# Altium schematic symbol library jlcpcb_2025_04_capacitors_extended_0603.schlib: 3668 symbols (part 18 of 20) (continued)
## HGC0603G0180J500NTHJ
designator C?  Capacitance: 18pF  (hidden comment: *)
Capacitor, Ceramic (MLCC), 18pF, ±5%, 50V, C0G, ±5%, SMD 0603; Manufacturer: Chinocera; Manufacturer Part Number: HGC0603G0180J500NTHJ; Package Size: 0603; JLCPCB Basic Part: No; JLCPCB Part Number: C482469; Supplier 1: LCSC; Category: Capacitors - MLCC; Supplier Part Number 1: C482469; Tolerance: ±5%; Voltage Rating: 50V; Temperature Coefficient: C0G; RoHS: Yes; ComponentLink1Description: Datasheet; ComponentLink1URL: https://wmsc.lcsc.com/wmsc/upload/file/pdf/v2/lcsc/2403201120_Chinocera-HGC0603G0180J500NTHJ_C482469.pdf; ComponentLink2Description: JLCPCB Part URL; ComponentLink2URL: https://jlcpcb.com/partdetail/C482469; ComponentLink3Description: LCSC Part URL; ComponentLink3URL: https://lcsc.com/product-detail/Multilayer-Ceramic-Capacitors-MLCC---SMD-SMT_Chinocera-Chinocera-HGC0603G0180J500NTHJ_C482469.html
footprint CAP-0603 (0603 (1608M) Capacitor)
pins: 1, 2

## HGC0603G0200J500NTHJ
designator C?  Capacitance: 20pF  (hidden comment: *)
Capacitor, Ceramic (MLCC), 20pF, ±5%, 50V, C0G, ±5%, SMD 0603; Manufacturer: Chinocera; Manufacturer Part Number: HGC0603G0200J500NTHJ; Package Size: 0603; JLCPCB Basic Part: No; JLCPCB Part Number: C465157; Supplier 1: LCSC; Category: Capacitors - MLCC; Supplier Part Number 1: C465157; Tolerance: ±5%; Voltage Rating: 50V; Temperature Coefficient: C0G; RoHS: Yes; ComponentLink1Description: Datasheet; ComponentLink1URL: https://wmsc.lcsc.com/wmsc/upload/file/pdf/v2/lcsc/2403201120_Chinocera-HGC0603G0200J500NTHJ_C465157.pdf; ComponentLink2Description: JLCPCB Part URL; ComponentLink2URL: https://jlcpcb.com/partdetail/C465157; ComponentLink3Description: LCSC Part URL; ComponentLink3URL: https://lcsc.com/product-detail/Multilayer-Ceramic-Capacitors-MLCC---SMD-SMT_Chinocera-Chinocera-HGC0603G0200J500NTHJ_C465157.html
footprint CAP-0603 (0603 (1608M) Capacitor)
pins: 1, 2

## HGC0603G0220J500NTHJ
designator C?  Capacitance: 22pF  (hidden comment: *)
Capacitor, Ceramic (MLCC), 22pF, ±5%, 50V, C0G, ±5%, SMD 0603; Manufacturer: Chinocera; Manufacturer Part Number: HGC0603G0220J500NTHJ; Package Size: 0603; JLCPCB Basic Part: No; JLCPCB Part Number: C465158; Supplier 1: LCSC; Category: Capacitors - MLCC; Supplier Part Number 1: C465158; Tolerance: ±5%; Voltage Rating: 50V; Temperature Coefficient: C0G; RoHS: Yes; ComponentLink1Description: Datasheet; ComponentLink1URL: https://wmsc.lcsc.com/wmsc/upload/file/pdf/v2/lcsc/2403201120_Chinocera-HGC0603G0220J500NTHJ_C465158.pdf; ComponentLink2Description: JLCPCB Part URL; ComponentLink2URL: https://jlcpcb.com/partdetail/C465158; ComponentLink3Description: LCSC Part URL; ComponentLink3URL: https://lcsc.com/product-detail/Multilayer-Ceramic-Capacitors-MLCC---SMD-SMT_Chinocera-Chinocera-HGC0603G0220J500NTHJ_C465158.html
footprint CAP-0603 (0603 (1608M) Capacitor)
pins: 1, 2

## HGC0603G0330J500NTHJ
designator C?  Capacitance: 33pF  (hidden comment: *)
Capacitor, Ceramic (MLCC), 33pF, ±5%, 50V, C0G, ±5%, SMD 0603; Manufacturer: Chinocera; Manufacturer Part Number: HGC0603G0330J500NTHJ; Package Size: 0603; JLCPCB Basic Part: No; JLCPCB Part Number: C465159; Supplier 1: LCSC; Category: Capacitors - MLCC; Supplier Part Number 1: C465159; Tolerance: ±5%; Voltage Rating: 50V; Temperature Coefficient: C0G; RoHS: Yes; ComponentLink1Description: Datasheet; ComponentLink1URL: https://wmsc.lcsc.com/wmsc/upload/file/pdf/v2/lcsc/2403201120_Chinocera-HGC0603G0330J500NTHJ_C465159.pdf; ComponentLink2Description: JLCPCB Part URL; ComponentLink2URL: https://jlcpcb.com/partdetail/C465159; ComponentLink3Description: LCSC Part URL; ComponentLink3URL: https://lcsc.com/product-detail/Multilayer-Ceramic-Capacitors-MLCC---SMD-SMT_Chinocera-Chinocera-HGC0603G0330J500NTHJ_C465159.html
footprint CAP-0603 (0603 (1608M) Capacitor)
pins: 1, 2

## HGC0603G0470J500NTHJ
designator C?  Capacitance: 47pF  (hidden comment: *)
Capacitor, Ceramic (MLCC), 47pF, ±5%, 50V, C0G, ±5%, SMD 0603; Manufacturer: Chinocera; Manufacturer Part Number: HGC0603G0470J500NTHJ; Package Size: 0603; JLCPCB Basic Part: No; JLCPCB Part Number: C465160; Supplier 1: LCSC; Category: Capacitors - MLCC; Supplier Part Number 1: C465160; Tolerance: ±5%; Voltage Rating: 50V; Temperature Coefficient: C0G; RoHS: Yes; ComponentLink1Description: Datasheet; ComponentLink1URL: https://wmsc.lcsc.com/wmsc/upload/file/pdf/v2/lcsc/2403201120_Chinocera-HGC0603G0470J500NTHJ_C465160.pdf; ComponentLink2Description: JLCPCB Part URL; ComponentLink2URL: https://jlcpcb.com/partdetail/C465160; ComponentLink3Description: LCSC Part URL; ComponentLink3URL: https://lcsc.com/product-detail/Multilayer-Ceramic-Capacitors-MLCC---SMD-SMT_Chinocera-Chinocera-HGC0603G0470J500NTHJ_C465160.html
footprint CAP-0603 (0603 (1608M) Capacitor)
pins: 1, 2

## HGC0603G0680J500NTHJ
designator C?  Capacitance: 68pF  (hidden comment: *)
Capacitor, Ceramic (MLCC), 68pF, ±5%, 50V, C0G, ±5%, SMD 0603; Manufacturer: Chinocera; Manufacturer Part Number: HGC0603G0680J500NTHJ; Package Size: 0603; JLCPCB Basic Part: No; JLCPCB Part Number: C482470; Supplier 1: LCSC; Category: Capacitors - MLCC; Supplier Part Number 1: C482470; Tolerance: ±5%; Voltage Rating: 50V; Temperature Coefficient: C0G; RoHS: Yes; ComponentLink1Description: Datasheet; ComponentLink1URL: https://wmsc.lcsc.com/wmsc/upload/file/pdf/v2/lcsc/2403201120_Chinocera-HGC0603G0680J500NTHJ_C482470.pdf; ComponentLink2Description: JLCPCB Part URL; ComponentLink2URL: https://jlcpcb.com/partdetail/C482470; ComponentLink3Description: LCSC Part URL; ComponentLink3URL: https://lcsc.com/product-detail/Multilayer-Ceramic-Capacitors-MLCC---SMD-SMT_Chinocera-Chinocera-HGC0603G0680J500NTHJ_C482470.html
footprint CAP-0603 (0603 (1608M) Capacitor)
pins: 1, 2

## HGC0603R5106M160NTHJ
designator C?  Capacitance: 10uF  (hidden comment: *)
Capacitor, Ceramic (MLCC), 10uF, ±20%, 16V, X5R, ±20%, SMD 0603; Manufacturer: Chinocera; Manufacturer Part Number: HGC0603R5106M160NTHJ; Package Size: 0603; JLCPCB Basic Part: No; JLCPCB Part Number: C7472959; Supplier 1: LCSC; Category: Capacitors - MLCC; Supplier Part Number 1: C7472959; Tolerance: ±20%; Voltage Rating: 16V; Temperature Coefficient: X5R; RoHS: Yes; ComponentLink1Description: Datasheet; ComponentLink1URL: https://wmsc.lcsc.com/wmsc/upload/file/pdf/v2/lcsc/2403201122_Chinocera-HGC0603R5106M160NTHJ_C7472959.pdf; ComponentLink2Description: JLCPCB Part URL; ComponentLink2URL: https://jlcpcb.com/partdetail/C7472959; ComponentLink3Description: LCSC Part URL; ComponentLink3URL: https://lcsc.com/product-detail/Multilayer-Ceramic-Capacitors-MLCC---SMD-SMT_Chinocera-Chinocera-HGC0603R5106M160NTHJ_C7472959.html
footprint CAP-0603 (0603 (1608M) Capacitor)
pins: 1, 2

## HGC0603R5106M250NTHJ
designator C?  Capacitance: 10uF  (hidden comment: *)
Capacitor, Ceramic (MLCC), 10uF, ±20%, 25V, X5R, ±20%, SMD 0603; Manufacturer: Chinocera; Manufacturer Part Number: HGC0603R5106M250NTHJ; Package Size: 0603; JLCPCB Basic Part: No; JLCPCB Part Number: C7472961; Supplier 1: LCSC; Category: Capacitors - MLCC; Supplier Part Number 1: C7472961; Tolerance: ±20%; Voltage Rating: 25V; Temperature Coefficient: X5R; RoHS: Yes; ComponentLink1Description: Datasheet; ComponentLink1URL: https://wmsc.lcsc.com/wmsc/upload/file/pdf/v2/lcsc/2403201122_Chinocera-HGC0603R5106M250NTHJ_C7472961.pdf; ComponentLink2Description: JLCPCB Part URL; ComponentLink2URL: https://jlcpcb.com/partdetail/C7472961; ComponentLink3Description: LCSC Part URL; ComponentLink3URL: https://lcsc.com/product-detail/Multilayer-Ceramic-Capacitors-MLCC---SMD-SMT_Chinocera-Chinocera-HGC0603R5106M250NTHJ_C7472961.html
footprint CAP-0603 (0603 (1608M) Capacitor)
pins: 1, 2

## HGC0603R5225K250NTHJ
designator C?  Capacitance: 2.2uF  (hidden comment: *)
Capacitor, Ceramic (MLCC), 2.2uF, ±10%, 25V, X5R, ±10%, SMD 0603; Manufacturer: Chinocera; Manufacturer Part Number: HGC0603R5225K250NTHJ; Package Size: 0603; JLCPCB Basic Part: No; JLCPCB Part Number: C7432768; Supplier 1: LCSC; Category: Capacitors - MLCC; Supplier Part Number 1: C7432768; Tolerance: ±10%; Voltage Rating: 25V; Temperature Coefficient: X5R; RoHS: Yes; ComponentLink1Description: Datasheet; ComponentLink1URL: https://wmsc.lcsc.com/wmsc/upload/file/pdf/v2/lcsc/2403201121_Chinocera-HGC0603R5225K250NTHJ_C7432768.pdf; ComponentLink2Description: JLCPCB Part URL; ComponentLink2URL: https://jlcpcb.com/partdetail/C7432768; ComponentLink3Description: LCSC Part URL; ComponentLink3URL: https://lcsc.com/product-detail/Multilayer-Ceramic-Capacitors-MLCC---SMD-SMT_Chinocera-Chinocera-HGC0603R5225K250NTHJ_C7432768.html
footprint CAP-0603 (0603 (1608M) Capacitor)
pins: 1, 2

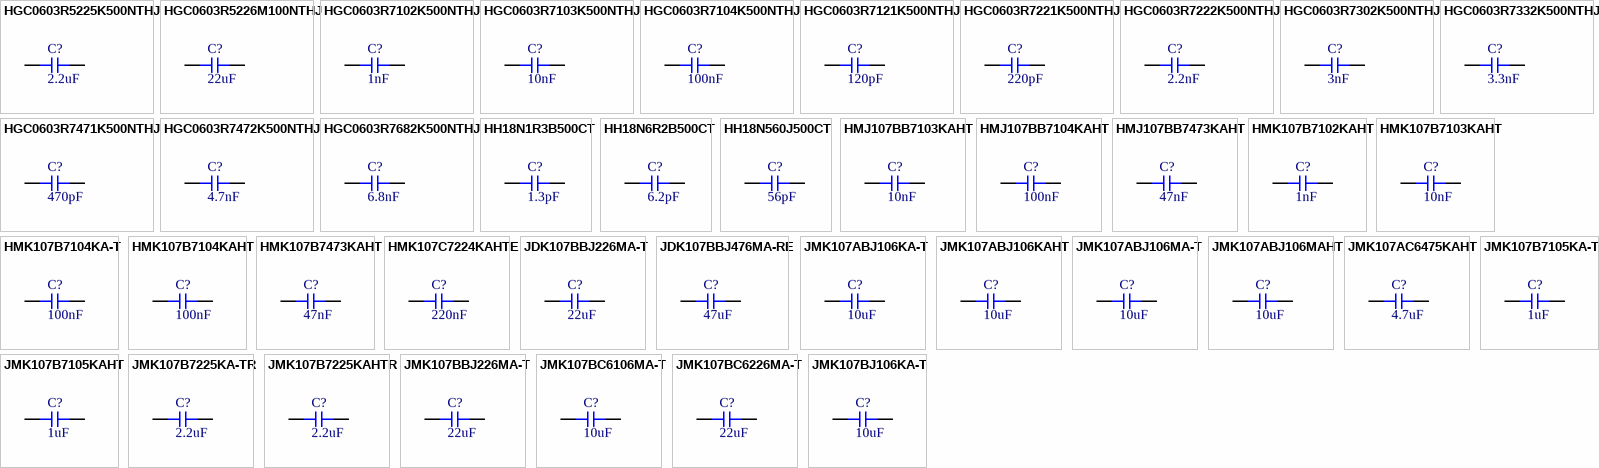
[diagram p81: symbols HGC0603R5225K500NTHJ to JMK107BJ106KA-T]

## HGC0603R5225K500NTHJ
designator C?  Capacitance: 2.2uF  (hidden comment: *)
Capacitor, Ceramic (MLCC), 2.2uF, ±10%, null, X5R, ±10%, SMD 0603; Manufacturer: Chinocera; Manufacturer Part Number: HGC0603R5225K500NTHJ; Package Size: 0603; JLCPCB Basic Part: No; JLCPCB Part Number: C7432769; Supplier 1: LCSC; Category: Capacitors - MLCC; Supplier Part Number 1: C7432769; Tolerance: ±10%; Voltage Rating: null; Temperature Coefficient: X5R; RoHS: Yes; ComponentLink1Description: Datasheet; ComponentLink1URL: https://wmsc.lcsc.com/wmsc/upload/file/pdf/v2/lcsc/2407081536_Chinocera-HGC0603R5225K500NTHJ_C7432769.pdf; ComponentLink2Description: JLCPCB Part URL; ComponentLink2URL: https://jlcpcb.com/partdetail/C7432769; ComponentLink3Description: LCSC Part URL; ComponentLink3URL: https://lcsc.com/product-detail/Multilayer-Ceramic-Capacitors-MLCC---SMD-SMT_Chinocera-Chinocera-HGC0603R5225K500NTHJ_C7432769.html
footprint CAP-0603 (0603 (1608M) Capacitor)
pins: 1, 2

## HGC0603R5226M100NTHJ
designator C?  Capacitance: 22uF  (hidden comment: *)
Capacitor, Ceramic (MLCC), 22uF, ±20%, 10V, X5R, ±20%, SMD 0603; Manufacturer: Chinocera; Manufacturer Part Number: HGC0603R5226M100NTHJ; Package Size: 0603; JLCPCB Basic Part: No; JLCPCB Part Number: C7432770; Supplier 1: LCSC; Category: Capacitors - MLCC; Supplier Part Number 1: C7432770; Tolerance: ±20%; Voltage Rating: 10V; Temperature Coefficient: X5R; RoHS: Yes; ComponentLink1Description: Datasheet; ComponentLink1URL: https://wmsc.lcsc.com/wmsc/upload/file/pdf/v2/lcsc/2403201121_Chinocera-HGC0603R5226M100NTHJ_C7432770.pdf; ComponentLink2Description: JLCPCB Part URL; ComponentLink2URL: https://jlcpcb.com/partdetail/C7432770; ComponentLink3Description: LCSC Part URL; ComponentLink3URL: https://lcsc.com/product-detail/Multilayer-Ceramic-Capacitors-MLCC---SMD-SMT_Chinocera-Chinocera-HGC0603R5226M100NTHJ_C7432770.html
footprint CAP-0603 (0603 (1608M) Capacitor)
pins: 1, 2

## HGC0603R7102K500NTHJ
designator C?  Capacitance: 1nF  (hidden comment: *)
Capacitor, Ceramic (MLCC), 1nF, ±10%, 50V, X7R, ±10%, SMD 0603; Manufacturer: Chinocera; Manufacturer Part Number: HGC0603R7102K500NTHJ; Package Size: 0603; JLCPCB Basic Part: No; JLCPCB Part Number: C482471; Supplier 1: LCSC; Category: Capacitors - MLCC; Supplier Part Number 1: C482471; Tolerance: ±10%; Voltage Rating: 50V; Temperature Coefficient: X7R; RoHS: Yes; ComponentLink1Description: Datasheet; ComponentLink1URL: https://wmsc.lcsc.com/wmsc/upload/file/pdf/v2/lcsc/2403201120_Chinocera-HGC0603R7102K500NTHJ_C482471.pdf; ComponentLink2Description: JLCPCB Part URL; ComponentLink2URL: https://jlcpcb.com/partdetail/C482471; ComponentLink3Description: LCSC Part URL; ComponentLink3URL: https://lcsc.com/product-detail/Multilayer-Ceramic-Capacitors-MLCC---SMD-SMT_Chinocera-Chinocera-HGC0603R7102K500NTHJ_C482471.html
footprint CAP-0603 (0603 (1608M) Capacitor)
pins: 1, 2

## HGC0603R7103K500NTHJ
designator C?  Capacitance: 10nF  (hidden comment: *)
Capacitor, Ceramic (MLCC), 10nF, ±10%, 50V, X7R, ±10%, SMD 0603; Manufacturer: Chinocera; Manufacturer Part Number: HGC0603R7103K500NTHJ; Package Size: 0603; JLCPCB Basic Part: No; JLCPCB Part Number: C482472; Supplier 1: LCSC; Category: Capacitors - MLCC; Supplier Part Number 1: C482472; Tolerance: ±10%; Voltage Rating: 50V; Temperature Coefficient: X7R; RoHS: Yes; ComponentLink1Description: Datasheet; ComponentLink1URL: https://wmsc.lcsc.com/wmsc/upload/file/pdf/v2/lcsc/2403201120_Chinocera-HGC0603R7103K500NTHJ_C482472.pdf; ComponentLink2Description: JLCPCB Part URL; ComponentLink2URL: https://jlcpcb.com/partdetail/C482472; ComponentLink3Description: LCSC Part URL; ComponentLink3URL: https://lcsc.com/product-detail/Multilayer-Ceramic-Capacitors-MLCC---SMD-SMT_Chinocera-Chinocera-HGC0603R7103K500NTHJ_C482472.html
footprint CAP-0603 (0603 (1608M) Capacitor)
pins: 1, 2

## HGC0603R7104K500NTHJ
designator C?  Capacitance: 100nF  (hidden comment: *)
Capacitor, Ceramic (MLCC), 100nF, ±10%, 50V, X7R, ±10%, SMD 0603; Manufacturer: Chinocera; Manufacturer Part Number: HGC0603R7104K500NTHJ; Package Size: 0603; JLCPCB Basic Part: No; JLCPCB Part Number: C482473; Supplier 1: LCSC; Category: Capacitors - MLCC; Supplier Part Number 1: C482473; Tolerance: ±10%; Voltage Rating: 50V; Temperature Coefficient: X7R; RoHS: Yes; ComponentLink1Description: Datasheet; ComponentLink1URL: https://wmsc.lcsc.com/wmsc/upload/file/pdf/v2/lcsc/2403201120_Chinocera-HGC0603R7104K500NTHJ_C482473.pdf; ComponentLink2Description: JLCPCB Part URL; ComponentLink2URL: https://jlcpcb.com/partdetail/C482473; ComponentLink3Description: LCSC Part URL; ComponentLink3URL: https://lcsc.com/product-detail/Multilayer-Ceramic-Capacitors-MLCC---SMD-SMT_Chinocera-Chinocera-HGC0603R7104K500NTHJ_C482473.html
footprint CAP-0603 (0603 (1608M) Capacitor)
pins: 1, 2

## HGC0603R7121K500NTHJ
designator C?  Capacitance: 120pF  (hidden comment: *)
Capacitor, Ceramic (MLCC), 120pF, ±10%, 50V, X7R, ±10%, SMD 0603; Manufacturer: Chinocera; Manufacturer Part Number: HGC0603R7121K500NTHJ; Package Size: 0603; JLCPCB Basic Part: No; JLCPCB Part Number: C5186690; Supplier 1: LCSC; Category: Capacitors - MLCC; Supplier Part Number 1: C5186690; Tolerance: ±10%; Voltage Rating: 50V; Temperature Coefficient: X7R; RoHS: Yes; ComponentLink1Description: Datasheet; ComponentLink1URL: https://wmsc.lcsc.com/wmsc/upload/file/pdf/v2/lcsc/2403201120_Chinocera-HGC0603R7121K500NTHJ_C5186690.pdf; ComponentLink2Description: JLCPCB Part URL; ComponentLink2URL: https://jlcpcb.com/partdetail/C5186690; ComponentLink3Description: LCSC Part URL; ComponentLink3URL: https://lcsc.com/product-detail/Multilayer-Ceramic-Capacitors-MLCC---SMD-SMT_Chinocera-Chinocera-HGC0603R7121K500NTHJ_C5186690.html
footprint CAP-0603 (0603 (1608M) Capacitor)
pins: 1, 2

## HGC0603R7221K500NTHJ
designator C?  Capacitance: 220pF  (hidden comment: *)
Capacitor, Ceramic (MLCC), 220pF, ±10%, 50V, X7R, ±10%, SMD 0603; Manufacturer: Chinocera; Manufacturer Part Number: HGC0603R7221K500NTHJ; Package Size: 0603; JLCPCB Basic Part: No; JLCPCB Part Number: C482474; Supplier 1: LCSC; Category: Capacitors - MLCC; Supplier Part Number 1: C482474; Tolerance: ±10%; Voltage Rating: 50V; Temperature Coefficient: X7R; RoHS: Yes; ComponentLink1Description: Datasheet; ComponentLink1URL: https://wmsc.lcsc.com/wmsc/upload/file/pdf/v2/lcsc/2403201120_Chinocera-HGC0603R7221K500NTHJ_C482474.pdf; ComponentLink2Description: JLCPCB Part URL; ComponentLink2URL: https://jlcpcb.com/partdetail/C482474; ComponentLink3Description: LCSC Part URL; ComponentLink3URL: https://lcsc.com/product-detail/Multilayer-Ceramic-Capacitors-MLCC---SMD-SMT_Chinocera-Chinocera-HGC0603R7221K500NTHJ_C482474.html
footprint CAP-0603 (0603 (1608M) Capacitor)
pins: 1, 2

## HGC0603R7222K500NTHJ
designator C?  Capacitance: 2.2nF  (hidden comment: *)
Capacitor, Ceramic (MLCC), 2.2nF, ±10%, 50V, X7R, ±10%, SMD 0603; Manufacturer: Chinocera; Manufacturer Part Number: HGC0603R7222K500NTHJ; Package Size: 0603; JLCPCB Basic Part: No; JLCPCB Part Number: C482475; Supplier 1: LCSC; Category: Capacitors - MLCC; Supplier Part Number 1: C482475; Tolerance: ±10%; Voltage Rating: 50V; Temperature Coefficient: X7R; RoHS: Yes; ComponentLink1Description: Datasheet; ComponentLink1URL: https://wmsc.lcsc.com/wmsc/upload/file/pdf/v2/lcsc/2403201120_Chinocera-HGC0603R7222K500NTHJ_C482475.pdf; ComponentLink2Description: JLCPCB Part URL; ComponentLink2URL: https://jlcpcb.com/partdetail/C482475; ComponentLink3Description: LCSC Part URL; ComponentLink3URL: https://lcsc.com/product-detail/Multilayer-Ceramic-Capacitors-MLCC---SMD-SMT_Chinocera-Chinocera-HGC0603R7222K500NTHJ_C482475.html
footprint CAP-0603 (0603 (1608M) Capacitor)
pins: 1, 2

## HGC0603R7302K500NTHJ
designator C?  Capacitance: 3nF  (hidden comment: *)
Capacitor, Ceramic (MLCC), 3nF, ±10%, 50V, X7R, ±10%, SMD 0603; Manufacturer: Chinocera; Manufacturer Part Number: HGC0603R7302K500NTHJ; Package Size: 0603; JLCPCB Basic Part: No; JLCPCB Part Number: C5186908; Supplier 1: LCSC; Category: Capacitors - MLCC; Supplier Part Number 1: C5186908; Tolerance: ±10%; Voltage Rating: 50V; Temperature Coefficient: X7R; RoHS: Yes; ComponentLink1Description: Datasheet; ComponentLink1URL: https://wmsc.lcsc.com/wmsc/upload/file/pdf/v2/lcsc/2403201121_Chinocera-HGC0603R7302K500NTHJ_C5186908.pdf; ComponentLink2Description: JLCPCB Part URL; ComponentLink2URL: https://jlcpcb.com/partdetail/C5186908; ComponentLink3Description: LCSC Part URL; ComponentLink3URL: https://lcsc.com/product-detail/Multilayer-Ceramic-Capacitors-MLCC---SMD-SMT_Chinocera-Chinocera-HGC0603R7302K500NTHJ_C5186908.html
footprint CAP-0603 (0603 (1608M) Capacitor)
pins: 1, 2

## HGC0603R7332K500NTHJ
designator C?  Capacitance: 3.3nF  (hidden comment: *)
Capacitor, Ceramic (MLCC), 3.3nF, ±10%, 50V, X7R, ±10%, SMD 0603; Manufacturer: Chinocera; Manufacturer Part Number: HGC0603R7332K500NTHJ; Package Size: 0603; JLCPCB Basic Part: No; JLCPCB Part Number: C482476; Supplier 1: LCSC; Category: Capacitors - MLCC; Supplier Part Number 1: C482476; Tolerance: ±10%; Voltage Rating: 50V; Temperature Coefficient: X7R; RoHS: Yes; ComponentLink1Description: Datasheet; ComponentLink1URL: https://wmsc.lcsc.com/wmsc/upload/file/pdf/v2/lcsc/2403201120_Chinocera-HGC0603R7332K500NTHJ_C482476.pdf; ComponentLink2Description: JLCPCB Part URL; ComponentLink2URL: https://jlcpcb.com/partdetail/C482476; ComponentLink3Description: LCSC Part URL; ComponentLink3URL: https://lcsc.com/product-detail/Multilayer-Ceramic-Capacitors-MLCC---SMD-SMT_Chinocera-Chinocera-HGC0603R7332K500NTHJ_C482476.html
footprint CAP-0603 (0603 (1608M) Capacitor)
pins: 1, 2

## HGC0603R7471K500NTHJ
designator C?  Capacitance: 470pF  (hidden comment: *)
Capacitor, Ceramic (MLCC), 470pF, ±10%, 50V, X7R, ±10%, SMD 0603; Manufacturer: Chinocera; Manufacturer Part Number: HGC0603R7471K500NTHJ; Package Size: 0603; JLCPCB Basic Part: No; JLCPCB Part Number: C482477; Supplier 1: LCSC; Category: Capacitors - MLCC; Supplier Part Number 1: C482477; Tolerance: ±10%; Voltage Rating: 50V; Temperature Coefficient: X7R; RoHS: Yes; ComponentLink1Description: Datasheet; ComponentLink1URL: https://wmsc.lcsc.com/wmsc/upload/file/pdf/v2/lcsc/2403201120_Chinocera-HGC0603R7471K500NTHJ_C482477.pdf; ComponentLink2Description: JLCPCB Part URL; ComponentLink2URL: https://jlcpcb.com/partdetail/C482477; ComponentLink3Description: LCSC Part URL; ComponentLink3URL: https://lcsc.com/product-detail/Multilayer-Ceramic-Capacitors-MLCC---SMD-SMT_Chinocera-Chinocera-HGC0603R7471K500NTHJ_C482477.html
footprint CAP-0603 (0603 (1608M) Capacitor)
pins: 1, 2

## HGC0603R7472K500NTHJ
designator C?  Capacitance: 4.7nF  (hidden comment: *)
Capacitor, Ceramic (MLCC), 4.7nF, ±10%, 50V, X7R, ±10%, SMD 0603; Manufacturer: Chinocera; Manufacturer Part Number: HGC0603R7472K500NTHJ; Package Size: 0603; JLCPCB Basic Part: No; JLCPCB Part Number: C482478; Supplier 1: LCSC; Category: Capacitors - MLCC; Supplier Part Number 1: C482478; Tolerance: ±10%; Voltage Rating: 50V; Temperature Coefficient: X7R; RoHS: Yes; ComponentLink1Description: Datasheet; ComponentLink1URL: https://wmsc.lcsc.com/wmsc/upload/file/pdf/v2/lcsc/2403201120_Chinocera-HGC0603R7472K500NTHJ_C482478.pdf; ComponentLink2Description: JLCPCB Part URL; ComponentLink2URL: https://jlcpcb.com/partdetail/C482478; ComponentLink3Description: LCSC Part URL; ComponentLink3URL: https://lcsc.com/product-detail/Multilayer-Ceramic-Capacitors-MLCC---SMD-SMT_Chinocera-Chinocera-HGC0603R7472K500NTHJ_C482478.html
footprint CAP-0603 (0603 (1608M) Capacitor)
pins: 1, 2

## HGC0603R7682K500NTHJ
designator C?  Capacitance: 6.8nF  (hidden comment: *)
Capacitor, Ceramic (MLCC), 6.8nF, ±10%, 50V, X7R, ±10%, SMD 0603; Manufacturer: Chinocera; Manufacturer Part Number: HGC0603R7682K500NTHJ; Package Size: 0603; JLCPCB Basic Part: No; JLCPCB Part Number: C482479; Supplier 1: LCSC; Category: Capacitors - MLCC; Supplier Part Number 1: C482479; Tolerance: ±10%; Voltage Rating: 50V; Temperature Coefficient: X7R; RoHS: Yes; ComponentLink1Description: Datasheet; ComponentLink1URL: https://wmsc.lcsc.com/wmsc/upload/file/pdf/v2/lcsc/2403201120_Chinocera-HGC0603R7682K500NTHJ_C482479.pdf; ComponentLink2Description: JLCPCB Part URL; ComponentLink2URL: https://jlcpcb.com/partdetail/C482479; ComponentLink3Description: LCSC Part URL; ComponentLink3URL: https://lcsc.com/product-detail/Multilayer-Ceramic-Capacitors-MLCC---SMD-SMT_Chinocera-Chinocera-HGC0603R7682K500NTHJ_C482479.html
footprint CAP-0603 (0603 (1608M) Capacitor)
pins: 1, 2

## HH18N1R3B500CT
designator C?  Capacitance: 1.3pF  (hidden comment: *)
Capacitor, Ceramic (MLCC), 1.3pF, 50V, NP0, SMD 0603; Manufacturer: Walsin Tech Corp; Manufacturer Part Number: HH18N1R3B500CT; Package Size: 0603; JLCPCB Basic Part: No; JLCPCB Part Number: C304338; Supplier 1: LCSC; Category: Capacitors - MLCC; Supplier Part Number 1: C304338; Voltage Rating: 50V; Temperature Coefficient: NP0; RoHS: Yes; ComponentLink1Description: Datasheet; ComponentLink1URL: https://wmsc.lcsc.com/wmsc/upload/file/pdf/v2/lcsc/2304140030_Walsin-Tech-Corp-HH18N1R3B500CT_C304338.pdf; ComponentLink2Description: JLCPCB Part URL; ComponentLink2URL: https://jlcpcb.com/partdetail/C304338; ComponentLink3Description: LCSC Part URL; ComponentLink3URL: https://lcsc.com/product-detail/Multilayer-Ceramic-Capacitors-MLCC---SMD-SMT_Walsin-Tech-Corp-Walsin-Tech-Corp-HH18N1R3B500CT_C304338.html
footprint CAP-0603 (0603 (1608M) Capacitor)
pins: 1, 2

## HH18N6R2B500CT
designator C?  Capacitance: 6.2pF  (hidden comment: *)
Capacitor, Ceramic (MLCC), 6.2pF, 50V, NP0, SMD 0603; Manufacturer: Walsin Tech Corp; Manufacturer Part Number: HH18N6R2B500CT; Package Size: 0603; JLCPCB Basic Part: No; JLCPCB Part Number: C525511; Supplier 1: LCSC; Category: Capacitors - MLCC; Supplier Part Number 1: C525511; Voltage Rating: 50V; Temperature Coefficient: NP0; RoHS: Yes; ComponentLink1Description: Datasheet; ComponentLink1URL: https://wmsc.lcsc.com/wmsc/upload/file/pdf/v2/lcsc/2005061436_Walsin-Tech-Corp-HH18N6R2B500CT_C525511.pdf; ComponentLink2Description: JLCPCB Part URL; ComponentLink2URL: https://jlcpcb.com/partdetail/C525511; ComponentLink3Description: LCSC Part URL; ComponentLink3URL: https://lcsc.com/product-detail/Multilayer-Ceramic-Capacitors-MLCC---SMD-SMT_Walsin-Tech-Corp-Walsin-Tech-Corp-HH18N6R2B500CT_C525511.html
footprint CAP-0603 (0603 (1608M) Capacitor)
pins: 1, 2

## HH18N560J500CT
designator C?  Capacitance: 56pF  (hidden comment: *)
Capacitor, Ceramic (MLCC), 56pF, ±5%, 50V, NP0, ±5%, SMD 0603; Manufacturer: Walsin Tech Corp; Manufacturer Part Number: HH18N560J500CT; Package Size: 0603; JLCPCB Basic Part: No; JLCPCB Part Number: C431816; Supplier 1: LCSC; Category: Capacitors - MLCC; Supplier Part Number 1: C431816; Tolerance: ±5%; Voltage Rating: 50V; Temperature Coefficient: NP0; RoHS: Yes; ComponentLink1Description: Datasheet; ComponentLink1URL: https://wmsc.lcsc.com/wmsc/upload/file/pdf/v2/lcsc/2304140030_Walsin-Tech-Corp-HH18N560J500CT_C431816.pdf; ComponentLink2Description: JLCPCB Part URL; ComponentLink2URL: https://jlcpcb.com/partdetail/C431816; ComponentLink3Description: LCSC Part URL; ComponentLink3URL: https://lcsc.com/product-detail/Multilayer-Ceramic-Capacitors-MLCC---SMD-SMT_Walsin-Tech-Corp-Walsin-Tech-Corp-HH18N560J500CT_C431816.html
footprint CAP-0603 (0603 (1608M) Capacitor)
pins: 1, 2

## HMJ107BB7103KAHT
designator C?  Capacitance: 10nF  (hidden comment: *)
Capacitor, Ceramic (MLCC), 10nF, ±10%, 100V, X7R, ±10%, SMD 0603; Manufacturer: Taiyo Yuden; Manufacturer Part Number: HMJ107BB7103KAHT; Package Size: 0603; JLCPCB Basic Part: No; JLCPCB Part Number: C841049; Supplier 1: LCSC; Category: Capacitors - MLCC; Supplier Part Number 1: C841049; Tolerance: ±10%; Voltage Rating: 100V; Temperature Coefficient: X7R; RoHS: Yes; ComponentLink1Description: Datasheet; ComponentLink1URL: https://wmsc.lcsc.com/wmsc/upload/file/pdf/v2/lcsc/2304140030_Taiyo-Yuden-HMJ107BB7103KAHT_C841049.pdf; ComponentLink2Description: JLCPCB Part URL; ComponentLink2URL: https://jlcpcb.com/partdetail/C841049; ComponentLink3Description: LCSC Part URL; ComponentLink3URL: https://lcsc.com/product-detail/Multilayer-Ceramic-Capacitors-MLCC---SMD-SMT_Taiyo-Yuden-Taiyo-Yuden-HMJ107BB7103KAHT_C841049.html
footprint CAP-0603 (0603 (1608M) Capacitor)
pins: 1, 2

## HMJ107BB7104KAHT
designator C?  Capacitance: 100nF  (hidden comment: *)
Capacitor, Ceramic (MLCC), 100nF, ±10%, 100V, X7R, ±10%, SMD 0603; Manufacturer: Taiyo Yuden; Manufacturer Part Number: HMJ107BB7104KAHT; Package Size: 0603; JLCPCB Basic Part: No; JLCPCB Part Number: C2170562; Supplier 1: LCSC; Category: Capacitors - MLCC; Supplier Part Number 1: C2170562; Tolerance: ±10%; Voltage Rating: 100V; Temperature Coefficient: X7R; RoHS: Yes; ComponentLink1Description: Datasheet; ComponentLink1URL: https://wmsc.lcsc.com/wmsc/upload/file/pdf/v2/lcsc/2309051410_Taiyo-Yuden-HMJ107BB7104KAHT_C2170562.pdf; ComponentLink2Description: JLCPCB Part URL; ComponentLink2URL: https://jlcpcb.com/partdetail/C2170562; ComponentLink3Description: LCSC Part URL; ComponentLink3URL: https://lcsc.com/product-detail/Multilayer-Ceramic-Capacitors-MLCC---SMD-SMT_Taiyo-Yuden-Taiyo-Yuden-HMJ107BB7104KAHT_C2170562.html
footprint CAP-0603 (0603 (1608M) Capacitor)
pins: 1, 2

## HMJ107BB7473KAHT
designator C?  Capacitance: 47nF  (hidden comment: *)
Capacitor, Ceramic (MLCC), 47nF, ±10%, 100V, ±10%, SMD 0603; Manufacturer: Taiyo Yuden; Manufacturer Part Number: HMJ107BB7473KAHT; Package Size: 0603; JLCPCB Basic Part: No; JLCPCB Part Number: C2169787; Supplier 1: LCSC; Category: Capacitors - MLCC; Supplier Part Number 1: C2169787; Tolerance: ±10%; Voltage Rating: 100V; RoHS: Yes; ComponentLink1Description: Datasheet; ComponentLink1URL: https://wmsc.lcsc.com/wmsc/upload/file/pdf/v2/lcsc/2309051421_Taiyo-Yuden-HMJ107BB7473KAHT_C2169787.pdf; ComponentLink2Description: JLCPCB Part URL; ComponentLink2URL: https://jlcpcb.com/partdetail/C2169787; ComponentLink3Description: LCSC Part URL; ComponentLink3URL: https://lcsc.com/product-detail/Multilayer-Ceramic-Capacitors-MLCC---SMD-SMT_Taiyo-Yuden-Taiyo-Yuden-HMJ107BB7473KAHT_C2169787.html
footprint CAP-0603 (0603 (1608M) Capacitor)
pins: 1, 2

## HMK107B7102KAHT
designator C?  Capacitance: 1nF  (hidden comment: *)
Capacitor, Ceramic (MLCC), 1nF, ±10%, 100V, X7R, ±10%, SMD 0603; Manufacturer: Taiyo Yuden; Manufacturer Part Number: HMK107B7102KAHT; Package Size: 0603; JLCPCB Basic Part: No; JLCPCB Part Number: C385969; Supplier 1: LCSC; Category: Capacitors - MLCC; Supplier Part Number 1: C385969; Tolerance: ±10%; Voltage Rating: 100V; Temperature Coefficient: X7R; RoHS: Yes; ComponentLink1Description: Datasheet; ComponentLink1URL: https://wmsc.lcsc.com/wmsc/upload/file/pdf/v2/lcsc/2110191430_Taiyo-Yuden-HMK107B7102KAHT_C385969.pdf; ComponentLink2Description: JLCPCB Part URL; ComponentLink2URL: https://jlcpcb.com/partdetail/C385969; ComponentLink3Description: LCSC Part URL; ComponentLink3URL: https://lcsc.com/product-detail/Multilayer-Ceramic-Capacitors-MLCC---SMD-SMT_Taiyo-Yuden-Taiyo-Yuden-HMK107B7102KAHT_C385969.html
footprint CAP-0603 (0603 (1608M) Capacitor)
pins: 1, 2

## HMK107B7103KAHT
designator C?  Capacitance: 10nF  (hidden comment: *)
Capacitor, Ceramic (MLCC), 10nF, ±10%, 100V, X7R, ±10%, SMD 0603; Manufacturer: Taiyo Yuden; Manufacturer Part Number: HMK107B7103KAHT; Package Size: 0603; JLCPCB Basic Part: No; JLCPCB Part Number: C385970; Supplier 1: LCSC; Category: Capacitors - MLCC; Supplier Part Number 1: C385970; Tolerance: ±10%; Voltage Rating: 100V; Temperature Coefficient: X7R; RoHS: Yes; ComponentLink1Description: Datasheet; ComponentLink1URL: https://wmsc.lcsc.com/wmsc/upload/file/pdf/v2/lcsc/1912111437_Taiyo-Yuden-HMK107B7103KAHT_C385970.pdf; ComponentLink2Description: JLCPCB Part URL; ComponentLink2URL: https://jlcpcb.com/partdetail/C385970; ComponentLink3Description: LCSC Part URL; ComponentLink3URL: https://lcsc.com/product-detail/Multilayer-Ceramic-Capacitors-MLCC---SMD-SMT_Taiyo-Yuden-Taiyo-Yuden-HMK107B7103KAHT_C385970.html
footprint CAP-0603 (0603 (1608M) Capacitor)
pins: 1, 2

## HMK107B7104KA-T
designator C?  Capacitance: 100nF  (hidden comment: *)
Capacitor, Ceramic (MLCC), 100nF, ±10%, 100V, X7R, ±10%, SMD 0603; Manufacturer: Taiyo Yuden; Manufacturer Part Number: HMK107B7104KA-T; Package Size: 0603; JLCPCB Basic Part: No; JLCPCB Part Number: C385971; Supplier 1: LCSC; Category: Capacitors - MLCC; Supplier Part Number 1: C385971; Tolerance: ±10%; Voltage Rating: 100V; Temperature Coefficient: X7R; RoHS: Yes; ComponentLink1Description: Datasheet; ComponentLink1URL: https://wmsc.lcsc.com/wmsc/upload/file/pdf/v2/lcsc/2304140030_Taiyo-Yuden-HMK107B7104KA-T_C385971.pdf; ComponentLink2Description: JLCPCB Part URL; ComponentLink2URL: https://jlcpcb.com/partdetail/C385971; ComponentLink3Description: LCSC Part URL; ComponentLink3URL: https://lcsc.com/product-detail/Multilayer-Ceramic-Capacitors-MLCC---SMD-SMT_Taiyo-Yuden-Taiyo-Yuden-HMK107B7104KA-T_C385971.html
footprint CAP-0603 (0603 (1608M) Capacitor)
pins: 1, 2

## HMK107B7104KAHT
designator C?  Capacitance: 100nF  (hidden comment: *)
Capacitor, Ceramic (MLCC), 100nF, ±10%, 100V, X7R, ±10%, SMD 0603; Manufacturer: Taiyo Yuden; Manufacturer Part Number: HMK107B7104KAHT; Package Size: 0603; JLCPCB Basic Part: No; JLCPCB Part Number: C268011; Supplier 1: LCSC; Category: Capacitors - MLCC; Supplier Part Number 1: C268011; Tolerance: ±10%; Voltage Rating: 100V; Temperature Coefficient: X7R; RoHS: Yes; ComponentLink1Description: Datasheet; ComponentLink1URL: https://wmsc.lcsc.com/wmsc/upload/file/pdf/v2/lcsc/1811011224_Taiyo-Yuden-HMK107B7104KAHT_C268011.pdf; ComponentLink2Description: JLCPCB Part URL; ComponentLink2URL: https://jlcpcb.com/partdetail/C268011; ComponentLink3Description: LCSC Part URL; ComponentLink3URL: https://lcsc.com/product-detail/Multilayer-Ceramic-Capacitors-MLCC---SMD-SMT_Taiyo-Yuden-Taiyo-Yuden-HMK107B7104KAHT_C268011.html
footprint CAP-0603 (0603 (1608M) Capacitor)
pins: 1, 2

## HMK107B7473KAHT
designator C?  Capacitance: 47nF  (hidden comment: *)
Capacitor, Ceramic (MLCC), 47nF, ±10%, 100V, X7R, ±10%, SMD 0603; Manufacturer: Taiyo Yuden; Manufacturer Part Number: HMK107B7473KAHT; Package Size: 0603; JLCPCB Basic Part: No; JLCPCB Part Number: C385972; Supplier 1: LCSC; Category: Capacitors - MLCC; Supplier Part Number 1: C385972; Tolerance: ±10%; Voltage Rating: 100V; Temperature Coefficient: X7R; RoHS: Yes; ComponentLink1Description: Datasheet; ComponentLink1URL: https://wmsc.lcsc.com/wmsc/upload/file/pdf/v2/lcsc/1912111437_Taiyo-Yuden-HMK107B7473KAHT_C385972.pdf; ComponentLink2Description: JLCPCB Part URL; ComponentLink2URL: https://jlcpcb.com/partdetail/C385972; ComponentLink3Description: LCSC Part URL; ComponentLink3URL: https://lcsc.com/product-detail/Multilayer-Ceramic-Capacitors-MLCC---SMD-SMT_Taiyo-Yuden-Taiyo-Yuden-HMK107B7473KAHT_C385972.html
footprint CAP-0603 (0603 (1608M) Capacitor)
pins: 1, 2

## HMK107C7224KAHTE
designator C?  Capacitance: 220nF  (hidden comment: *)
Capacitor, Ceramic (MLCC), 220nF, ±10%, 100V, ±10%, SMD 0603; Manufacturer: Taiyo Yuden; Manufacturer Part Number: HMK107C7224KAHTE; Package Size: 0603; JLCPCB Basic Part: No; JLCPCB Part Number: C2169715; Supplier 1: LCSC; Category: Capacitors - MLCC; Supplier Part Number 1: C2169715; Tolerance: ±10%; Voltage Rating: 100V; RoHS: Yes; ComponentLink1Description: Datasheet; ComponentLink1URL: https://wmsc.lcsc.com/wmsc/upload/file/pdf/v2/lcsc/2211282030_Taiyo-Yuden-HMK107C7224KAHTE_C2169715.pdf; ComponentLink2Description: JLCPCB Part URL; ComponentLink2URL: https://jlcpcb.com/partdetail/C2169715; ComponentLink3Description: LCSC Part URL; ComponentLink3URL: https://lcsc.com/product-detail/Multilayer-Ceramic-Capacitors-MLCC---SMD-SMT_Taiyo-Yuden-Taiyo-Yuden-HMK107C7224KAHTE_C2169715.html
footprint CAP-0603 (0603 (1608M) Capacitor)
pins: 1, 2

## JDK107BBJ226MA-T
designator C?  Capacitance: 22uF  (hidden comment: *)
Capacitor, Ceramic (MLCC), 22uF, ±20%, 6.3V, X5R, ±20%, SMD 0603; Manufacturer: Taiyo Yuden; Manufacturer Part Number: JDK107BBJ226MA-T; Package Size: 0603; JLCPCB Basic Part: No; JLCPCB Part Number: C268010; Supplier 1: LCSC; Category: Capacitors - MLCC; Supplier Part Number 1: C268010; Tolerance: ±20%; Voltage Rating: 6.3V; Temperature Coefficient: X5R; RoHS: Yes; ComponentLink1Description: Datasheet; ComponentLink1URL: https://wmsc.lcsc.com/wmsc/upload/file/pdf/v2/lcsc/1912111437_Taiyo-Yuden-JDK107BBJ226MA-T_C268010.pdf; ComponentLink2Description: JLCPCB Part URL; ComponentLink2URL: https://jlcpcb.com/partdetail/C268010; ComponentLink3Description: LCSC Part URL; ComponentLink3URL: https://lcsc.com/product-detail/Multilayer-Ceramic-Capacitors-MLCC---SMD-SMT_Taiyo-Yuden-Taiyo-Yuden-JDK107BBJ226MA-T_C268010.html
footprint CAP-0603 (0603 (1608M) Capacitor)
pins: 1, 2

## JDK107BBJ476MA-RE
designator C?  Capacitance: 47uF  (hidden comment: *)
Capacitor, Ceramic (MLCC), 47uF, ±20%, 6.3V, ±20%, SMD 0603; Manufacturer: Taiyo Yuden; Manufacturer Part Number: JDK107BBJ476MA-RE; Package Size: 0603; JLCPCB Basic Part: No; JLCPCB Part Number: C385995; Supplier 1: LCSC; Category: Capacitors - MLCC; Supplier Part Number 1: C385995; Tolerance: ±20%; Voltage Rating: 6.3V; RoHS: Yes; ComponentLink1Description: Datasheet; ComponentLink1URL: https://wmsc.lcsc.com/wmsc/upload/file/pdf/v2/lcsc/2304140030_Taiyo-Yuden-JDK107BBJ476MA-RE_C385995.pdf; ComponentLink2Description: JLCPCB Part URL; ComponentLink2URL: https://jlcpcb.com/partdetail/C385995; ComponentLink3Description: LCSC Part URL; ComponentLink3URL: https://lcsc.com/product-detail/Multilayer-Ceramic-Capacitors-MLCC---SMD-SMT_Taiyo-Yuden-Taiyo-Yuden-JDK107BBJ476MA-RE_C385995.html
footprint CAP-0603 (0603 (1608M) Capacitor)
pins: 1, 2

## JMK107ABJ106KA-T
designator C?  Capacitance: 10uF  (hidden comment: *)
Capacitor, Ceramic (MLCC), 10uF, ±10%, 6.3V, X5R, ±10%, SMD 0603; Manufacturer: Taiyo Yuden; Manufacturer Part Number: JMK107ABJ106KA-T; Package Size: 0603; JLCPCB Basic Part: No; JLCPCB Part Number: C319196; Supplier 1: LCSC; Category: Capacitors - MLCC; Supplier Part Number 1: C319196; Tolerance: ±10%; Voltage Rating: 6.3V; Temperature Coefficient: X5R; RoHS: Yes; ComponentLink1Description: Datasheet; ComponentLink1URL: https://wmsc.lcsc.com/wmsc/upload/file/pdf/v2/lcsc/2304140030_Taiyo-Yuden-JMK107ABJ106KA-T_C319196.pdf; ComponentLink2Description: JLCPCB Part URL; ComponentLink2URL: https://jlcpcb.com/partdetail/C319196; ComponentLink3Description: LCSC Part URL; ComponentLink3URL: https://lcsc.com/product-detail/Multilayer-Ceramic-Capacitors-MLCC---SMD-SMT_Taiyo-Yuden-Taiyo-Yuden-JMK107ABJ106KA-T_C319196.html
footprint CAP-0603 (0603 (1608M) Capacitor)
pins: 1, 2

## JMK107ABJ106KAHT
designator C?  Capacitance: 10uF  (hidden comment: *)
Capacitor, Ceramic (MLCC), 10uF, ±10%, 6.3V, X5R, ±10%, SMD 0603; Manufacturer: Taiyo Yuden; Manufacturer Part Number: JMK107ABJ106KAHT; Package Size: 0603; JLCPCB Basic Part: No; JLCPCB Part Number: C650947; Supplier 1: LCSC; Category: Capacitors - MLCC; Supplier Part Number 1: C650947; Tolerance: ±10%; Voltage Rating: 6.3V; Temperature Coefficient: X5R; RoHS: Yes; ComponentLink1Description: Datasheet; ComponentLink1URL: https://wmsc.lcsc.com/wmsc/upload/file/pdf/v2/lcsc/2304140030_Taiyo-Yuden-JMK107ABJ106KAHT_C650947.pdf; ComponentLink2Description: JLCPCB Part URL; ComponentLink2URL: https://jlcpcb.com/partdetail/C650947; ComponentLink3Description: LCSC Part URL; ComponentLink3URL: https://lcsc.com/product-detail/Multilayer-Ceramic-Capacitors-MLCC---SMD-SMT_Taiyo-Yuden-Taiyo-Yuden-JMK107ABJ106KAHT_C650947.html
footprint CAP-0603 (0603 (1608M) Capacitor)
pins: 1, 2

## JMK107ABJ106MA-T
designator C?  Capacitance: 10uF  (hidden comment: *)
Capacitor, Ceramic (MLCC), 10uF, ±20%, 6.3V, X5R, ±20%, SMD 0603; Manufacturer: Taiyo Yuden; Manufacturer Part Number: JMK107ABJ106MA-T; Package Size: 0603; JLCPCB Basic Part: No; JLCPCB Part Number: C268008; Supplier 1: LCSC; Category: Capacitors - MLCC; Supplier Part Number 1: C268008; Tolerance: ±20%; Voltage Rating: 6.3V; Temperature Coefficient: X5R; RoHS: Yes; ComponentLink1Description: Datasheet; ComponentLink1URL: https://wmsc.lcsc.com/wmsc/upload/file/pdf/v2/lcsc/2211282230_Taiyo-Yuden-JMK107ABJ106MA-T_C268008.pdf; ComponentLink2Description: JLCPCB Part URL; ComponentLink2URL: https://jlcpcb.com/partdetail/C268008; ComponentLink3Description: LCSC Part URL; ComponentLink3URL: https://lcsc.com/product-detail/Multilayer-Ceramic-Capacitors-MLCC---SMD-SMT_Taiyo-Yuden-Taiyo-Yuden-JMK107ABJ106MA-T_C268008.html
footprint CAP-0603 (0603 (1608M) Capacitor)
pins: 1, 2

## JMK107ABJ106MAHT
designator C?  Capacitance: 10uF  (hidden comment: *)
Capacitor, Ceramic (MLCC), 10uF, ±20%, 6.3V, X5R, ±20%, SMD 0603; Manufacturer: Taiyo Yuden; Manufacturer Part Number: JMK107ABJ106MAHT; Package Size: 0603; JLCPCB Basic Part: No; JLCPCB Part Number: C412452; Supplier 1: LCSC; Category: Capacitors - MLCC; Supplier Part Number 1: C412452; Tolerance: ±20%; Voltage Rating: 6.3V; Temperature Coefficient: X5R; RoHS: Yes; ComponentLink1Description: Datasheet; ComponentLink1URL: https://wmsc.lcsc.com/wmsc/upload/file/pdf/v2/lcsc/2304140030_Taiyo-Yuden-JMK107ABJ106MAHT_C412452.pdf; ComponentLink2Description: JLCPCB Part URL; ComponentLink2URL: https://jlcpcb.com/partdetail/C412452; ComponentLink3Description: LCSC Part URL; ComponentLink3URL: https://lcsc.com/product-detail/Multilayer-Ceramic-Capacitors-MLCC---SMD-SMT_Taiyo-Yuden-Taiyo-Yuden-JMK107ABJ106MAHT_C412452.html
footprint CAP-0603 (0603 (1608M) Capacitor)
pins: 1, 2

## JMK107AC6475KAHT
designator C?  Capacitance: 4.7uF  (hidden comment: *)
Capacitor, Ceramic (MLCC), 4.7uF, ±10%, 6.3V, ±10%, SMD 0603; Manufacturer: Taiyo Yuden; Manufacturer Part Number: JMK107AC6475KAHT; Package Size: 0603; JLCPCB Basic Part: No; JLCPCB Part Number: C651001; Supplier 1: LCSC; Category: Capacitors - MLCC; Supplier Part Number 1: C651001; Tolerance: ±10%; Voltage Rating: 6.3V; RoHS: Yes; ComponentLink1Description: Datasheet; ComponentLink1URL: https://wmsc.lcsc.com/wmsc/upload/file/pdf/v2/lcsc/2304140030_Taiyo-Yuden-JMK107AC6475KAHT_C651001.pdf; ComponentLink2Description: JLCPCB Part URL; ComponentLink2URL: https://jlcpcb.com/partdetail/C651001; ComponentLink3Description: LCSC Part URL; ComponentLink3URL: https://lcsc.com/product-detail/Multilayer-Ceramic-Capacitors-MLCC---SMD-SMT_Taiyo-Yuden-Taiyo-Yuden-JMK107AC6475KAHT_C651001.html
footprint CAP-0603 (0603 (1608M) Capacitor)
pins: 1, 2

## JMK107B7105KA-T
designator C?  Capacitance: 1uF  (hidden comment: *)
Capacitor, Ceramic (MLCC), 1uF, ±10%, 6.3V, X7R, ±10%, SMD 0603; Manufacturer: Taiyo Yuden; Manufacturer Part Number: JMK107B7105KA-T; Package Size: 0603; JLCPCB Basic Part: No; JLCPCB Part Number: C92781; Supplier 1: LCSC; Category: Capacitors - MLCC; Supplier Part Number 1: C92781; Tolerance: ±10%; Voltage Rating: 6.3V; Temperature Coefficient: X7R; RoHS: Yes; ComponentLink1Description: Datasheet; ComponentLink1URL: https://wmsc.lcsc.com/wmsc/upload/file/pdf/v2/lcsc/1810091421_Taiyo-Yuden-JMK107B7105KA-T_C92781.pdf; ComponentLink2Description: JLCPCB Part URL; ComponentLink2URL: https://jlcpcb.com/partdetail/C92781; ComponentLink3Description: LCSC Part URL; ComponentLink3URL: https://lcsc.com/product-detail/Multilayer-Ceramic-Capacitors-MLCC---SMD-SMT_Taiyo-Yuden-Taiyo-Yuden-JMK107B7105KA-T_C92781.html
footprint CAP-0603 (0603 (1608M) Capacitor)
pins: 1, 2

## JMK107B7105KAHT
designator C?  Capacitance: 1uF  (hidden comment: *)
Capacitor, Ceramic (MLCC), 1uF, ±10%, 6.3V, ±10%, SMD 0603; Manufacturer: Taiyo Yuden; Manufacturer Part Number: JMK107B7105KAHT; Package Size: 0603; JLCPCB Basic Part: No; JLCPCB Part Number: C841051; Supplier 1: LCSC; Category: Capacitors - MLCC; Supplier Part Number 1: C841051; Tolerance: ±10%; Voltage Rating: 6.3V; RoHS: Yes; ComponentLink1Description: Datasheet; ComponentLink1URL: https://wmsc.lcsc.com/wmsc/upload/file/pdf/v2/lcsc/2304140030_Taiyo-Yuden-JMK107B7105KAHT_C841051.pdf; ComponentLink2Description: JLCPCB Part URL; ComponentLink2URL: https://jlcpcb.com/partdetail/C841051; ComponentLink3Description: LCSC Part URL; ComponentLink3URL: https://lcsc.com/product-detail/Multilayer-Ceramic-Capacitors-MLCC---SMD-SMT_Taiyo-Yuden-Taiyo-Yuden-JMK107B7105KAHT_C841051.html
footprint CAP-0603 (0603 (1608M) Capacitor)
pins: 1, 2

## JMK107B7225KA-TR
designator C?  Capacitance: 2.2uF  (hidden comment: *)
Capacitor, Ceramic (MLCC), 2.2uF, ±10%, 6.3V, X7R, ±10%, SMD 0603; Manufacturer: Taiyo Yuden; Manufacturer Part Number: JMK107B7225KA-TR; Package Size: 0603; JLCPCB Basic Part: No; JLCPCB Part Number: C412627; Supplier 1: LCSC; Category: Capacitors - MLCC; Supplier Part Number 1: C412627; Tolerance: ±10%; Voltage Rating: 6.3V; Temperature Coefficient: X7R; RoHS: Yes; ComponentLink1Description: Datasheet; ComponentLink1URL: https://wmsc.lcsc.com/wmsc/upload/file/pdf/v2/lcsc/2211282230_Taiyo-Yuden-JMK107B7225KA-TR_C412627.pdf; ComponentLink2Description: JLCPCB Part URL; ComponentLink2URL: https://jlcpcb.com/partdetail/C412627; ComponentLink3Description: LCSC Part URL; ComponentLink3URL: https://lcsc.com/product-detail/Multilayer-Ceramic-Capacitors-MLCC---SMD-SMT_Taiyo-Yuden-Taiyo-Yuden-JMK107B7225KA-TR_C412627.html
footprint CAP-0603 (0603 (1608M) Capacitor)
pins: 1, 2

## JMK107B7225KAHTR
designator C?  Capacitance: 2.2uF  (hidden comment: *)
Capacitor, Ceramic (MLCC), 2.2uF, ±10%, 6.3V, X7R, ±10%, SMD 0603; Manufacturer: Taiyo Yuden; Manufacturer Part Number: JMK107B7225KAHTR; Package Size: 0603; JLCPCB Basic Part: No; JLCPCB Part Number: C386014; Supplier 1: LCSC; Category: Capacitors - MLCC; Supplier Part Number 1: C386014; Tolerance: ±10%; Voltage Rating: 6.3V; Temperature Coefficient: X7R; RoHS: Yes; ComponentLink1Description: Datasheet; ComponentLink1URL: https://wmsc.lcsc.com/wmsc/upload/file/pdf/v2/lcsc/2211282230_Taiyo-Yuden-JMK107B7225KAHTR_C386014.pdf; ComponentLink2Description: JLCPCB Part URL; ComponentLink2URL: https://jlcpcb.com/partdetail/C386014; ComponentLink3Description: LCSC Part URL; ComponentLink3URL: https://lcsc.com/product-detail/Multilayer-Ceramic-Capacitors-MLCC---SMD-SMT_Taiyo-Yuden-Taiyo-Yuden-JMK107B7225KAHTR_C386014.html
footprint CAP-0603 (0603 (1608M) Capacitor)
pins: 1, 2

## JMK107BBJ226MA-T
designator C?  Capacitance: 22uF  (hidden comment: *)
Capacitor, Ceramic (MLCC), 22uF, ±20%, 6.3V, X5R, ±20%, SMD 0603; Manufacturer: Taiyo Yuden; Manufacturer Part Number: JMK107BBJ226MA-T; Package Size: 0603; JLCPCB Basic Part: No; JLCPCB Part Number: C87153; Supplier 1: LCSC; Category: Capacitors - MLCC; Supplier Part Number 1: C87153; Tolerance: ±20%; Voltage Rating: 6.3V; Temperature Coefficient: X5R; RoHS: Yes; ComponentLink1Description: Datasheet; ComponentLink1URL: https://wmsc.lcsc.com/wmsc/upload/file/pdf/v2/lcsc/2304140030_Taiyo-Yuden-JMK107BBJ226MA-T_C87153.pdf; ComponentLink2Description: JLCPCB Part URL; ComponentLink2URL: https://jlcpcb.com/partdetail/C87153; ComponentLink3Description: LCSC Part URL; ComponentLink3URL: https://lcsc.com/product-detail/Multilayer-Ceramic-Capacitors-MLCC---SMD-SMT_Taiyo-Yuden-Taiyo-Yuden-JMK107BBJ226MA-T_C87153.html
footprint CAP-0603 (0603 (1608M) Capacitor)
pins: 1, 2

## JMK107BC6106MA-T
designator C?  Capacitance: 10uF  (hidden comment: *)
Capacitor, Ceramic (MLCC), 10uF, ±20%, 6.3V, X6S, ±20%, SMD 0603; Manufacturer: Taiyo Yuden; Manufacturer Part Number: JMK107BC6106MA-T; Package Size: 0603; JLCPCB Basic Part: No; JLCPCB Part Number: C669868; Supplier 1: LCSC; Category: Capacitors - MLCC; Supplier Part Number 1: C669868; Tolerance: ±20%; Voltage Rating: 6.3V; Temperature Coefficient: X6S; RoHS: Yes; ComponentLink1Description: Datasheet; ComponentLink1URL: https://wmsc.lcsc.com/wmsc/upload/file/pdf/v2/lcsc/2211282200_Taiyo-Yuden-JMK107BC6106MA-T_C669868.pdf; ComponentLink2Description: JLCPCB Part URL; ComponentLink2URL: https://jlcpcb.com/partdetail/C669868; ComponentLink3Description: LCSC Part URL; ComponentLink3URL: https://lcsc.com/product-detail/Multilayer-Ceramic-Capacitors-MLCC---SMD-SMT_Taiyo-Yuden-Taiyo-Yuden-JMK107BC6106MA-T_C669868.html
footprint CAP-0603 (0603 (1608M) Capacitor)
pins: 1, 2
